# Altium footprint library PcbLib1.PcbLib: 136 footprints (part 1 of 9)
Each footprint in its own frame and in the unit in brackets; x right, y up, seen from the top. Pads: shape width x height; smd on the part's side, far side on the other; paste and mask are expansions set on the pad; w line width, h text height; cw(c..) or ccw(c..) is an arc to the next point about the centre after c.
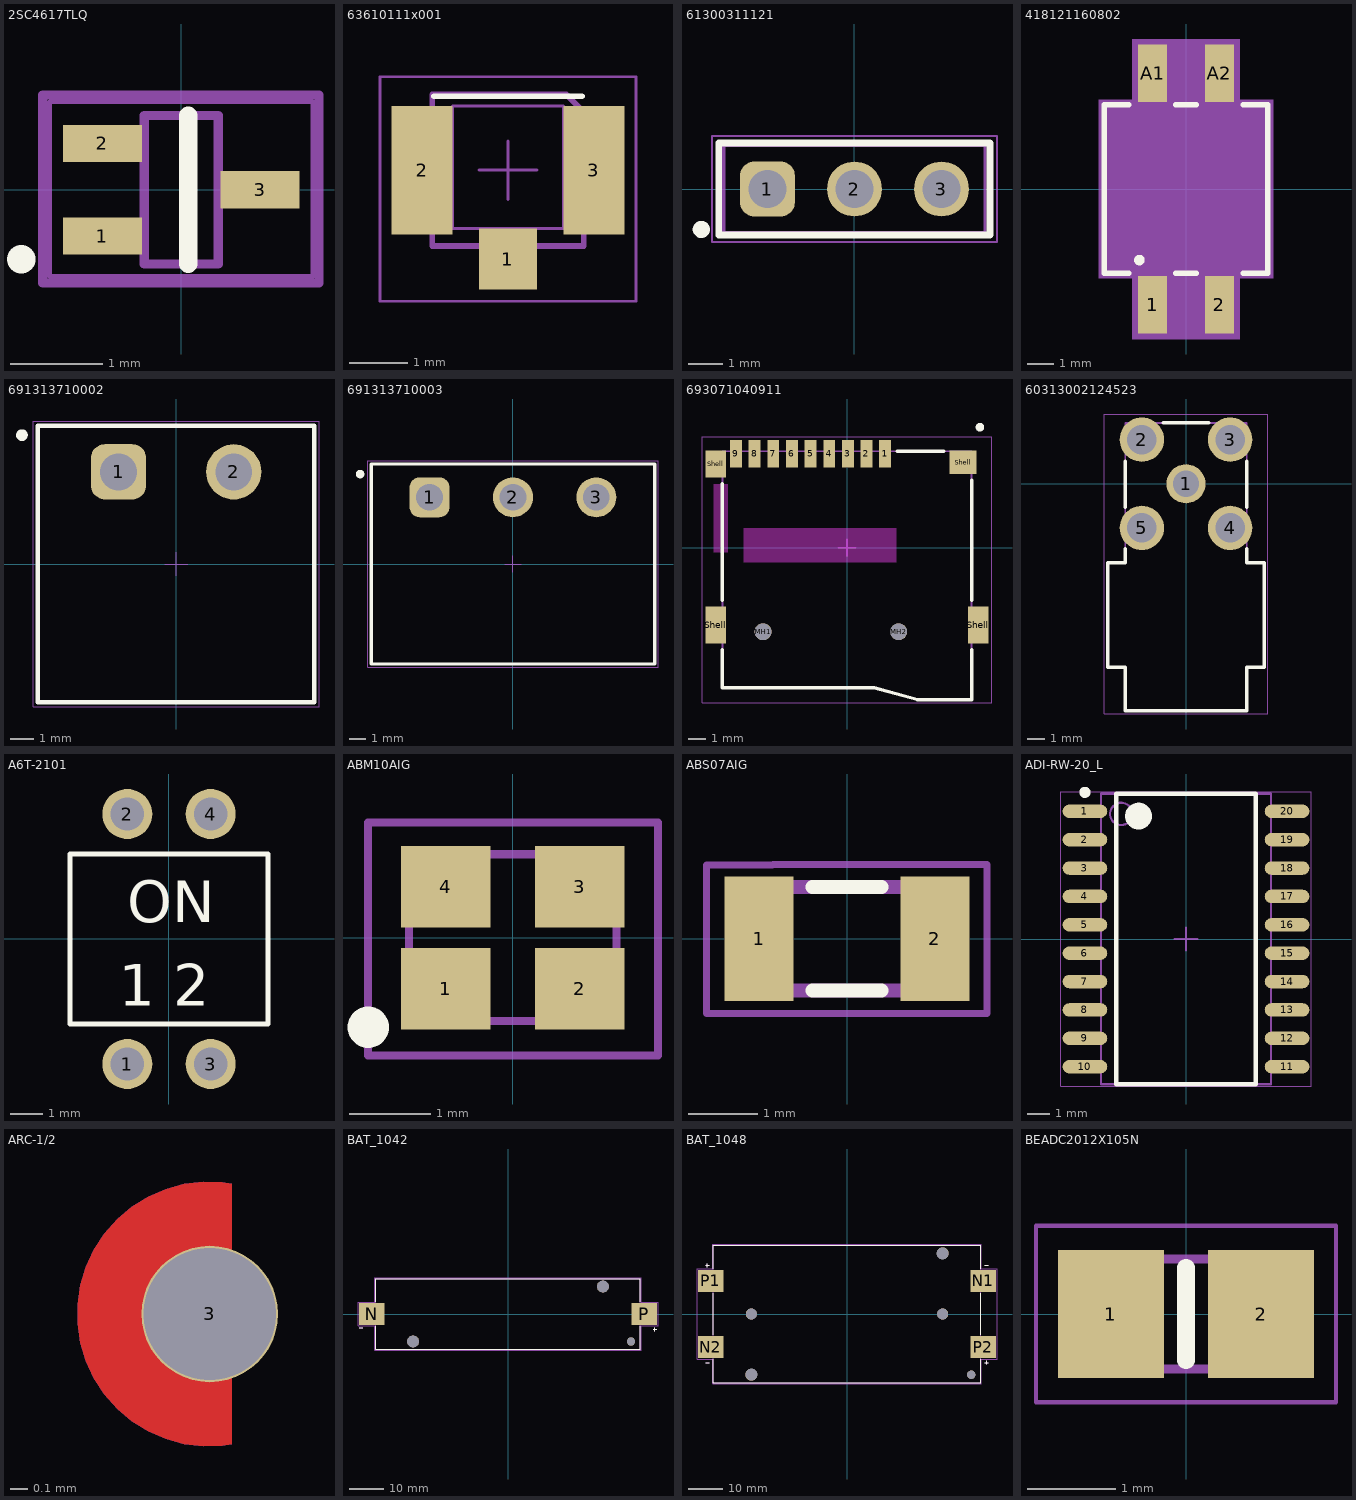
[diagram p0: the footprints below, top view; thin cyan lines are the x and y axes]

## 2SC4617TLQ [mm]
pads (3):
  rect 0.85x0.4 smd: 1(-0.85,-0.5) 2(-0.85,0.5) 3(0.85,0)
Top Overlay:
  circle w0.254: c-1.725,-0.75 r0.025
  lines w0.2: 0.075,-0.8 0.075,0.8
Top Courtyard:
  lines w0.102: -1.494,-1.006 1.487,-1.006 1.487,1.023 -1.494,1.023 -1.494,-1.006
Mechanical 13:
  lines w0.1: -0.4,-0.8 -0.4,0.8 0.4,0.8 0.4,-0.8 -0.4,-0.8
Mechanical 15:
  lines w0.05: -1.419,-0.936 -1.419,0.95 1.421,0.95 1.421,-0.936 -1.419,-0.936
3D body "2SC4617TLQ.stp": height 0.75, standoff 0, extent -0.8,-0.8 0.8,0.8

## 63610111x001 [mm]
pads (3):
  rect 1x1.05 smd: 1(-1270,-1271.525)
  rect 1.05x2.2 smd: 2(-1271.475,-1270) 3(-1268.525,-1270)
Top Overlay:
  lines w0.102: -1271.27,-1268.73 -1268.73,-1268.73
Top Courtyard:
  lines w0.05: -1270.5,-1270 -1269.5,-1270 ; -1270,-1270.5 -1270,-1269.5 ; -1272.2,-1272.25 -1272.2,-1268.395 -1267.8,-1268.395 -1267.8,-1272.25 -1272.2,-1272.25 ; -1270.95,-1271 -1270.95,-1268.9 -1269.05,-1268.9 -1269.05,-1271 -1270.95,-1271
  text "Cutout  / prohibition  / area" at -1271.05,-1270.35 h0.2
Top 3D Body:
  lines w0.1: -1271.3,-1271.3 -1268.7,-1271.3 -1268.7,-1269 -1269,-1268.7 -1271.3,-1268.7 -1271.3,-1271.3
Top Component Outline:
  lines w0.1: -1271.3,-1271.3 -1271.3,-1268.7 -1269,-1268.7 -1268.7,-1269 -1268.7,-1271.3 -1271.3,-1271.3
Top Designator:
  text ".Designator" at -1271,-1270.067 h0.2
3D body "63610111x001.stp": height 1.25, standoff 0, extent -1271.5,-1271.55 -1268.5,-1268.449

## 61300311121 [mm]
pads (3):
  rrect50% 1.6x1.6 hole 1.1: 1(-2.54,0)
  round 1.6 hole 1.1: 2(0,0) 3(2.54,0)
Top Overlay:
  circle w0.25: c-4.471,-1.179 r0.125
  lines w0.2: -3.96,-1.345 -3.96,1.345 3.96,1.345 3.96,-1.345 -3.96,-1.345
Top Courtyard:
  lines w0.05: -4.16,-1.545 4.16,-1.545 4.16,1.545 -4.16,1.545 -4.16,-1.545
Top Component Outline:
  lines w0.1: -3.81,-1.27 3.81,-1.27 3.81,1.27 -3.81,1.27 -3.81,-1.27
Top Designator:
  text ".Designator" at -1.001,-1.133 h0.2
Top Component Center:
  lines w0.05: -0.5,0 0.5,0 ; 0,-0.5 0,0.5
3D body: height 0.25, standoff 0, extent -3.81,-1.27 3.81,1.27

## 418121160802 [mm]
pads (4):
  rect 1.1x2.2 smd: 1(-1.27,-4.4) 2(1.27,-4.4) A1(-1.27,4.4) A2(1.27,4.4)
Top Overlay:
  circle w0.2: c-1.77,-2.7 r0.1
  lines w0.2: -2.17,-3.2 -3.11,-3.2 -3.11,3.2 -2.17,3.2 ; -0.4,-3.2 0.4,-3.2 ; -0.4,3.2 0.4,3.2 ; 2.17,-3.2 3.11,-3.2 3.11,3.2 2.17,3.2
Mechanical 13:
  lines w0.1: -3.01,-3.1 3.01,-3.1 3.01,3.1 -3.01,3.1 -3.01,-3.1
Mechanical 15:
  region: 2.05,3.4 3.31,3.4 3.31,-3.4 2.05,-3.4 2.05,-5.7 -2.05,-5.7 -2.05,-3.4 -3.31,-3.4 -3.31,3.4 -2.05,3.4 -2.05,5.7 2.05,5.7
3D body "step_temp.STEP": height 3.72, standoff -0.03, extent -2.883,-5.275 3.137,4.513

## 691313710002 [mm]
pads (2):
  rrect50% 2.4x2.4 hole 1.6: 1(-2.5,4)
  round 2.4 hole 1.6: 2(2.5,4)
Top Overlay:
  circle w0.254: c-6.694,5.594 r0.127
  lines w0.2: -6,-6 6,-6 6,6 -6,6 -6,-6
Top Courtyard:
  lines w0.05: -6.2,-6.2 -6.2,6.2 6.2,6.2 6.2,-6.2 -6.2,-6.2
Top 3D Body:
  lines w0.1: -6,-6 6,-6 6,6 -6,6 -6,-6
Top Component Outline:
  lines w0.1: -6,-6 -6,6 6,6 6,-6 -6,-6
Top Designator:
  text ".Designator" at -1,-0.067 h0.2
Top Component Center:
  lines w0.05: -0.5,0 0.5,0 ; 0,-0.5 0,0.5
3D body "691313710002.stp": height 8.55, standoff -3.45, extent -6,-6 6,6

## 691313710003 [mm]
pads (3):
  rrect50% 2.4x2.4 hole 1.6: 1(-5,4)
  round 2.4 hole 1.6: 2(0,4) 3(5,4)
Top Overlay:
  circle w0.254: c-9.163,5.392 r0.127
  lines w0.2: -8.5,-6 8.5,-6 8.5,6 -8.5,6 -8.5,-6
Top Courtyard:
  lines w0.05: -8.7,-6.2 -8.7,6.2 8.7,6.2 8.7,-6.2 -8.7,-6.2
Top 3D Body:
  lines w0.1: -8.5,-6 8.5,-6 8.5,6 -8.5,6 -8.5,-6
Top Component Outline:
  lines w0.1: -8.5,-6 -8.5,6 8.5,6 8.5,-6 -8.5,-6
Top Designator:
  text ".Designator" at -7.498,-0.5 h1.5
Top Component Center:
  lines w0.05: -0.5,0 0.5,0 ; 0,-0.5 0,0.5
3D body "691313710003.stp": height 8.55, standoff -3.45, extent -8.5,-6 8.5,6

## 693071040911 [mm]
pads (15):
  rect 0.7x1.6 smd: 1(2.25,5.55) 2(1.15,5.55) 3(0.05,5.55) 4(-1.05,5.55) 5(-2.15,5.55) 6(-3.25,5.55) 7(-4.35,5.55) 8(-5.45,5.55) 9(-6.55,5.55)
  round 1 hole 1 unplated: MH1(-4.95,-4.95) MH2(3.05,-4.95)
  rect 1.2x2.2 smd: Shell(-7.75,-4.55) Shell(7.75,-4.55)
  rect 1.2x1.6 smd: Shell(-7.75,4.95)
  rect 1.6x1.4 smd: Shell(6.85,5.05)
Top Layer keep-out:
  region: -7.05,3.75 -7.85,3.75 -7.85,-0.25 -7.05,-0.25
  region: -6.1,1.15 2.9,1.15 2.9,-0.85 -6.1,-0.85
Top Overlay:
  circle w0.254: c7.842,7.119 r0.127
  lines w0.2: -7.35,-6 -7.35,-8.25 1.6,-8.25 4.15,-8.95 7.35,-8.95 7.35,-6 ; -7.35,-3.1 -7.35,3.8 ; 2.95,5.7 5.7,5.7 ; 7.35,-3.1 7.35,4
Top Courtyard:
  lines w0.05: -8.55,-9.15 -8.55,6.55 8.55,6.55 8.55,-9.15 -8.55,-9.15
Top 3D Body:
  lines w0.1: -7.35,-8.25 -7.35,5.7 7.35,5.7 7.35,-8.95 4.15,-8.95 1.6,-8.25 -7.35,-8.25
Top Assembly:
  lines w0.1: -7.35,-8.25 -7.35,5.7 7.35,5.7 7.35,-8.95 4.15,-8.95 1.6,-8.25 -7.35,-8.25
Top Designator:
  text ".Designator" at -3.647,-0.357 h1
Top Component Center:
  lines w0.1: -0.5,0 0.5,0 ; 0,-0.5 0,0.5
3D body "693071040911.stp": height 1.9, standoff -0.55, extent -8.05,-8.95 8.05,6.05

## 60313002124523 [mm]
pads (5):
  round 2.25 hole 1.5: 1(0,0)
  round 2.55 hole 1.7: 2(-2.54,2.54) 3(2.54,2.54) 4(2.54,-2.54) 5(-2.54,-2.54)
Top Overlay:
  lines w0.2: -3.5,-3.75 -3.5,-4.55 -4.5,-4.55 -4.5,-10.55 -3.5,-10.55 -3.5,-13.05 3.5,-13.05 3.5,-10.55 4.5,-10.55 4.5,-4.55 3.5,-4.55 3.5,-3.75 ; -3.5,-1.35 -3.5,1.3 ; -1.3,3.5 1.3,3.5 ; 3.5,-1.35 3.5,1.3
Top Courtyard:
  lines w0.05: -4.7,-13.25 4.7,-13.25 4.7,4.015 -4.7,4.015 -4.7,-13.25
Top Assembly:
  lines w0.1: -4.5,-10.55 -4.5,-4.55 -3.5,-4.55 -3.5,-3.5 -3.5,3.5 3.5,3.5 3.5,-3.5 3.5,-4.55 4.5,-4.55 4.5,-10.55 3.5,-10.55 3.5,-13.05 -3.5,-13.05 -3.5,-10.55 -4.5,-10.55
Top Designator:
  text ".Designator" at -3.647,-6.707 h1
Top Component Center:
  lines w0.1: -0.5,0 0.5,0 ; 0,-0.5 0,0.5
3D body "60313002124523.stp": height 10.19, standoff -3.91, extent -4.519,-13.05 4.519,3.5

## A6T-2101 [mil]
pads (4):
  round 60 hole 40: 1(-49.95,-150.04) 2(-49.95,149.96) 3(50.05,-150.04) 4(50.05,149.96)
Top Overlay:
  lines w6: -118.46,-102.09 -118.46,102 118.55,102 118.55,-102.09 -118.46,-102.09
  text "ON" at -50,20 h50
  text "1 2" at -60,-80 h50
Mechanical 13:
  region: 60.05,139.96 40.05,139.96 40.05,159.96 60.05,159.96
  region: 60.05,-160.04 40.05,-160.04 40.05,-140.04 60.05,-140.04
  region: -39.95,139.96 -59.95,139.96 -59.95,159.96 -39.95,159.96
  region: -39.95,-160.04 -59.95,-160.04 -59.95,-140.04 -39.95,-140.04
3D body "step_temp.STEP": height 141.73, standoff -137.8, extent -118.5,-154.92 118.5,154.92

## ABM10AIG [mm]
pads (4):
  rect 1.1x1 smd: 1(-0.825,-0.625) 2(0.825,-0.625) 3(0.825,0.625) 4(-0.825,0.625)
Top Overlay:
  circle w0.254: c-1.775,-1.1 r0.127
Mechanical 13:
  lines w0.1: -1.275,-1.025 -1.275,1.025 1.275,1.025 1.275,-1.025 -1.275,-1.025
Mechanical 15:
  lines w0.1: -1.779,-1.449 1.784,-1.449 1.784,1.417 -1.779,1.417 -1.779,-1.449
3D body "ABM10AIG-40.000MHZ-7-J1Z-T.stp": height 0.75, standoff 0, extent -1.275,-1.025 1.275,1.025

## ABS07AIG [mm]
pads (2):
  rect 1x1.8 smd: 1(-1.275,0) 2(1.275,0)
Top Overlay:
  lines w0.2: -0.5,-0.75 0.5,-0.75 ; -0.5,0.75 0.5,0.75
Mechanical 13:
  lines w0.2: -1.6,-0.75 1.6,-0.75 1.6,0.75 -1.6,0.75 -1.6,-0.75
Mechanical 15:
  lines w0.102: -2.034,-1.081 2.033,-1.081 2.033,1.074 -1.074,1.074 -1.079,1.07 -2.034,1.07 -2.034,-1.081
3D body "ABS07AIG-32.768KHZ-7-T.stp": height 0.9, standoff 0, extent -1.58,-0.75 1.62,0.75

## ADI-RW-20_L [mm]
pads (20):
  oval 2x0.6 smd: 1(-4.525,5.715) 2(-4.525,4.445) 3(-4.525,3.175) 4(-4.525,1.905) 5(-4.525,0.635) 6(-4.525,-0.635) 7(-4.525,-1.905) 8(-4.525,-3.175) 9(-4.525,-4.445) 10(-4.525,-5.715) 11(4.525,-5.715) 12(4.525,-4.445) 13(4.525,-3.175) 14(4.525,-1.905) 15(4.525,-0.635) 16(4.525,0.635) 17(4.525,1.905) 18(4.525,3.175) 19(4.525,4.445) 20(4.525,5.715)
Top Overlay:
  circle w0.25: c-4.525,6.565 r0.125
  circle w0.6: c-2.125,5.5 r0.3
  lines w0.2: -3.125,-6.5 -3.125,6.5 3.125,6.5 3.125,-6.5 -3.125,-6.5
Top Courtyard:
  lines w0.05: -5.6,-6.6 -5.6,6.6 5.6,6.6 5.6,-6.6 -5.6,-6.6
  lines w0.1: -0.5,0 0.5,0 ; 0,-0.5 0,0.5
Top 3D Body:
  circle w0.1: c-2.9,5.6 r0.5
  lines w0.1: -3.8,-6.5 -3.8,6.5 3.8,6.5 3.8,-6.5 -3.8,-6.5
3D body: height 2.65, standoff 0.1, extent -3.8,-6.5 3.8,6.5

## ARC-1/2 [mil] "Arc pad     inner radius-5mil 01x1"
pads (1):
  round 31 hole 30 paste-99999 mask-99999: 3(375,90)
Top Layer:
  region: 380,60.42 377.85,60.06 373.5,59.96 369.18,60.49 364.98,61.64 360.99,63.38 357.3,65.68 353.97,68.49 351.09,71.75 348.7,75.39 346.87,79.34 345.63,83.51 345,87.82 345,89.99 345,92.17 345.63,96.48 346.87,100.65 348.7,104.6 351.09,108.24 353.97,111.5 357.3,114.31 360.99,116.61 364.98,118.36 369.18,119.51 373.5,120.04 377.85,119.94 380,119.58
Bottom Layer:
  region: 380,60.42 377.85,60.06 373.5,59.96 369.18,60.49 364.98,61.64 360.99,63.38 357.3,65.68 353.97,68.49 351.09,71.75 348.7,75.39 346.87,79.34 345.63,83.51 345,87.82 345,89.99 345,92.17 345.63,96.48 346.87,100.65 348.7,104.6 351.09,108.24 353.97,111.5 357.3,114.31 360.99,116.61 364.98,118.36 369.18,119.51 373.5,120.04 377.85,119.94 380,119.58
Top Paste:
  region: 380,60.42 377.85,60.06 373.5,59.96 369.18,60.49 364.98,61.64 360.99,63.38 357.3,65.68 353.97,68.49 351.09,71.75 348.7,75.39 346.87,79.34 345.63,83.51 345,87.82 345,89.99 345,92.17 345.63,96.48 346.87,100.65 348.7,104.6 351.09,108.24 353.97,111.5 357.3,114.31 360.99,116.61 364.98,118.36 369.18,119.51 373.5,120.04 377.85,119.94 380,119.58
Bottom Paste:
  region: 380,60.42 377.85,60.06 373.5,59.96 369.18,60.49 364.98,61.64 360.99,63.38 357.3,65.68 353.97,68.49 351.09,71.75 348.7,75.39 346.87,79.34 345.63,83.51 345,87.82 345,89.99 345,92.17 345.63,96.48 346.87,100.65 348.7,104.6 351.09,108.24 353.97,111.5 357.3,114.31 360.99,116.61 364.98,118.36 369.18,119.51 373.5,120.04 377.85,119.94 380,119.58
Top Solder:
  region: 341,89.99 341,87.53 341.71,82.65 343.12,77.92 345.2,73.44 347.9,69.32 351.17,65.62 354.94,62.44 359.13,59.83 363.65,57.85 368.41,56.55 373.3,55.95 378.24,56.06 380.67,56.48 381.37,56.59 382.6,57.3 383.51,58.38 384,59.71 384,60.42 384,119.58 384,120.29 383.51,121.62 382.6,122.7 381.36,123.4 380.66,123.52 378.23,123.93 373.3,124.04 368.4,123.44 363.65,122.14 359.12,120.16 354.94,117.56 351.17,114.37 347.9,110.68 345.2,106.55 343.12,102.07 341.71,97.35 341,92.46 341,90
Bottom Solder:
  region: 341,89.99 341,87.53 341.71,82.65 343.12,77.92 345.2,73.44 347.9,69.32 351.17,65.62 354.94,62.44 359.13,59.83 363.65,57.85 368.41,56.55 373.3,55.95 378.24,56.06 380.67,56.48 381.37,56.59 382.6,57.3 383.51,58.38 384,59.71 384,60.42 384,119.58 384,120.29 383.51,121.62 382.6,122.7 381.36,123.4 380.66,123.52 378.23,123.93 373.3,124.04 368.4,123.44 363.65,122.14 359.12,120.16 354.94,117.56 351.17,114.37 347.9,110.68 345.2,106.55 343.12,102.07 341.71,97.35 341,92.46 341,90

## BAT_1042 [mm]
height 15.11
pads (5):
  rect 7.46x6.47 smd: N(-39.67,0) P(39.67,0)
  round 3.45 hole 3.45 unplated: ""(-27.6,-8) ""(27.6,8)
  round 2.39 hole 2.39 unplated: ""(35.82,-8)
Top Overlay:
  lines w0.127: -43.25,-4 -42.25,-4 ; -38.525,-3.55 -38.525,-10.325 38.525,-10.325 38.525,-3.55 ; -38.525,3.55 -38.525,10.325 38.525,10.325 38.525,3.55 ; 42.25,-4.5 43.25,-4.5 ; 42.75,-5 42.75,-4
Mechanical 13:
  lines w0.127: -43.25,-4 -42.25,-4 ; 42.25,-4.5 43.25,-4.5 ; 42.75,-5 42.75,-4 ; -38.525,-10.325 38.525,-10.325 38.525,10.325 -38.525,10.325 -38.525,-10.325
Mechanical 15:
  lines w0.05: -43.65,-3.485 -38.775,-3.485 -38.775,-10.575 38.775,-10.575 38.775,-3.485 43.65,-3.485 43.65,3.485 38.775,3.485 38.775,10.575 -38.775,10.575 -38.775,3.485 -43.65,3.485 -43.65,-3.485
3D body "step_temp.STEP": height 14.86, standoff -3.43, extent -43.231,-10.325 43.231,10.325

## BAT_1048 [mm]
height 14.85
pads (9):
  rect 7.34x6.35 smd: N1(39.33,9.555) N2(-39.33,-9.555) P1(-39.33,9.555) P2(39.33,-9.555)
  round 3.45 hole 3.45 unplated: ""(-27.6,-17.505) ""(27.6,17.505)
  round 3.17 hole 3.17 unplated: ""(-27.6,0) ""(27.6,0)
  round 2.39 hole 2.39 unplated: ""(35.82,-17.505)
Top Overlay:
  lines w0.127: -40.75,-14 -39.75,-14 ; -40.75,14 -39.75,14 ; -40.25,13.5 -40.25,14.5 ; -38.53,-13.05 -38.53,-19.89 38.53,-19.89 38.53,-13.05 ; -38.53,-5.95 -38.53,5.95 ; -38.53,13.05 -38.53,19.89 38.53,19.89 38.53,13.05 ; 38.53,-5.95 38.53,5.95 ; 39.75,-14 40.75,-14 ; 39.75,14 40.75,14 ; 40.25,-14.5 40.25,-13.5
Mechanical 13:
  lines w0.127: -40.75,-14 -39.75,-14 ; -40.75,14 -39.75,14 ; -40.25,13.5 -40.25,14.5 ; 39.75,-14 40.75,-14 ; 39.75,14 40.75,14 ; 40.25,-14.5 40.25,-13.5 ; -38.53,-19.89 38.53,-19.89 38.53,19.89 -38.53,19.89 -38.53,-19.89
Mechanical 15:
  lines w0.05: -43.25,-13 -38.78,-13 -38.78,-20.14 38.78,-20.14 38.78,-13 43.25,-13 43.25,13 38.78,13 38.78,20.14 -38.78,20.14 -38.78,13 -43.25,13 -43.25,-13
3D body "step_temp.STEP": height 14.91, standoff -3.43, extent -42.977,-19.926 42.977,19.85

## BEADC2012X105N [mm]
pads (2):
  rect 1.2x1.45 smd: 1(-0.85,0) 2(0.85,0)
Top Overlay:
  lines w0.2: 0,-0.525 0,0.525
Mechanical 13:
  lines w0.1: -1,-0.625 -1,0.625 1,0.625 1,-0.625 -1,-0.625
Mechanical 15:
  lines w0.05: -1.7,-1 -1.7,1 1.7,1 1.7,-1 -1.7,-1
3D body "MMZ2012Y601BT000.stp": height 1.05, standoff 0, extent -1,-0.625 1,0.625